# Altium footprint library STguitar.PcbLib: 33 footprints (part 3 of 3)
Each footprint in its own frame and in the unit in brackets; x right, y up, seen from the top. Pads: shape width x height; smd on the part's side, far side on the other; paste and mask are expansions set on the pad; w line width, h text height; cw(c..) or ccw(c..) is an arc to the next point about the centre after c.
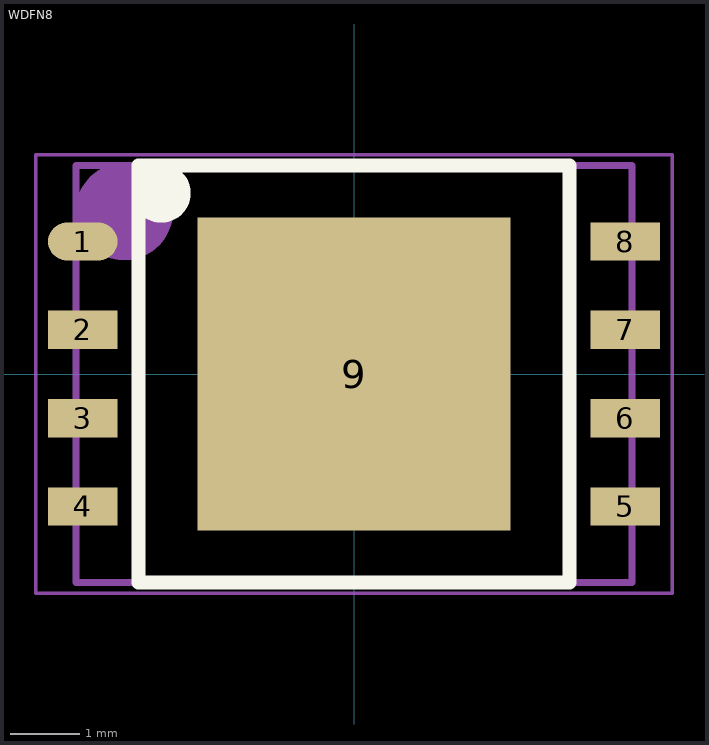
[diagram p2: the footprint, top view; thin cyan lines are the x and y axes]

## WDFN8 [mm]
pads (9):
  oval 1x0.55 smd: 1(-3.9,1.905)
  rect 1x0.55 smd: 2(-3.9,0.635) 3(-3.9,-0.635) 4(-3.9,-1.905) 5(3.9,-1.905) 6(3.9,-0.635) 7(3.9,0.635) 8(3.9,1.905)
  rect 4.5x4.5 smd: 9(0,0)
Top Overlay:
  circle w0.45: c-2.775,2.6 r0.2
  lines w0.2: -3.1,-3 -3.1,3 0,3 3.1,3 3.1,-3 0,-3 -3.1,-3
Mechanical 13:
  lines w0.1: -4,-3 4,-3 4,3 -4,3 -4,-3
  lines w1: -3.102,2.337 cw(c-3.302,2.337) -3.103,2.358
  text ".Designator" at -2.85,-0.025 h1
Top Component Outline (Mech15):
  lines w0.05: -4.575,-3.15 4.575,-3.15 4.575,3.15 -4.575,3.15 -4.575,-3.15
3D body "MT25QL128ABA1EW9-0SIT_TR.stp": height 0.8, standoff 0, extent -4.05,-3 4.05,3